# Altium integrated library Mastermind Devices.IntLib: 910 symbols (part 1 of 6) (continued)
## ATMEGA2560-16AU (continued)

## ATSAM3UxCA-AU
designator U?, comment ATSAM3U2CA-AU
IC MCU 32bit 128kB flash 100LQFP; Manufacturer: Atmel; 2nd source part number: 184-1662; Artikkelnr Noca: 15019073; Artikkelnr Simpro: N.A.; Part Number: ATSAM3U2CA-AU; Manufacturer Part Number: ATSAM3U2CA-AU; Datasheet: http://www.atmel.com/Images/6430s.pdf; LatestRevisionDate: 2012-06-01; Pin Count: 100; Publisher: Nordic Semiconductor; Published: 2012-06-01; Value: ATSAM3U2CA-AU; Note: *; Supplier: Digi-Key; Supplier part number: ATSAM3U2CA-AU-ND; 2nd source Supplier: Farnell; Footprint Doc: LQFP-100
footprint TSQFP50P1600X1600X160-100N
pins: 1 VDDANA (power), 2 ADVREF (in), 3 GNDANA (power), 4 AD12BVREF (io), 5 PA22/TXD2/RTS1/AD12B0 (io), 6 PA30/TF/TIOA2/AD12B1 (io), 7 PB3/PWMH3/A5/AD12BAB2 (io), 8 PB4/TCLK1/A6/AD12BAB3 (io), 9 VDDCORE (power), 10 PA13/MISO (io), 11 PA14/MOSI (io), 12 PA15/SPCK/PWMH2 (io), 13 PA16/NPCS0/NCS1 (io), 14 PA17/SCK0/ADTRG (io), 15 PB16/D7/PWMH3 (io), 16 PB15/D6/PWMH2 (io), 17 PA18/TXD0/PWMFI2 (io), 18 PA19/RXD0/NPCS3 (io), 19 PA20/TXD1/PWMH3 (io), 20 PA21/RXD1/PCK0 (io), 21 PA23/RXD2/CTS1 (io), 22 VDDIO (power), 23 PA24/TWD1/SCK1 (io), 24 PA25/TWCK1/SCK2 (io), 25 PA26/TD/TCLK2 (io), 26 PA0/TIOB0/NPCS1 (io), 27 PA1/TIOA0/NPCS2 (io), 28 PA2/TCLK0/AD12BTRG (io), 29 PA3/MCCK/PCK1 (io), 30 PA4/MCCDA/PWMH0 (io), 31 PA5/MCDA0/PWMH1 (io), 32 PA6/MCDA1/PWMH2 (io), 33 PA7/MCDA2/PWML0 (io), 34 VDDCORE (power), 35 GND (power), 36 VDDIO (power), 37 PA8/MCDA3/PWML1 (io), 38 PA9/TWD0/PWML2 (io), 39 PA10/TWCK0/PWML3 (io), 40 PA11/URXD/PWMFI0 (io), 41 PA12/UTXD/PWMFI1 (io), 42 FWUP (in), 43 ERASE (in), 44 TEST (in), 45 VDDBU (power), 46 GNDBU (power), 47 NRSTB (in), 48 JTAGSEL (in), 49 XOUT32 (out), 50 XIN32 (in), 51 TDI (in), 52 VDDOUT (power), 53 VDDIN (power), 54 TDO (out), 55 TMS (in), 56 TCK (in), 57 NRST (io), 58 NANDRDY/PCK1/PB24 (io), 59 VDDCORE (power), 60 VDDIO (power), 61 GND (power), 62 NWR0/NWE/PCK2/PB23 (io), 63 A22/NANDCLE/CTS2/PB22 (io), 64 A21(NANDALE/RTS2/PB21 (io), 65 NCS0/PWML3/PB20 (io), 66 NRD/PWML2/PB19 (io), 67 NANDWE/PWML1/PB18 (io), 68 NANDOE/PWML0/PB17 (io), 69 D5/PWMH1/PB14 (io), 70 D1/DSR0/PB10 (io), 71 D0/DTR0/PB9 (io), 72 GNDPLL (power), 73 VDDPLL (power), 74 XOUT (out), 75 XIN (in), 76 DHSDP (io), 77 DHSDM (io), 78 VBG (power), 79 VDDUTMI (power), 80 DFSDM (io), 81 DFSDP (io), 82 GNDUTMI (power), 83 VDDCORE (power), 84 TK/PWMH0/PA28 (io), 85 RK/PWMH1/PA29 (io), 86 RF/TIOB2/PA31 (io), 87 VDDCORE (power), 88 VDDIO (power), 89 GND (power), 90 PWMH0/A2/PB0 (io), 91 PWMH1/A3/PB1 (io), 92 PWMH2/A4/PB2 (io), 93 D2/DCD0/PB11 (io), 94 D3/RI0/PB12 (io), 95 D4/PWMH0/PB13 (io), 96 RD/PCK0/PA27 (io), 97 TIOA1/A7/AD0/PB5 (io), 98 TIOB1/D15/AD1/PB6 (io), 99 RTS0/A0/NBS0/AD2/PB7 (io), 100 CTS0/A1/AD3/PB8 (io)

## ATTINY10
designator IC?, comment ATtiny4/5/9/108-bit Microcontroller with 512/1024 Bytes In-System Programmable Flash
footprint SOT23-6
pins: 1 PB0, 2 GND (power), 3 PB1, 4 PB2, 5 VCC (power), 6 /RST

## ATTINY10-MAHR
designator IC?, comment ATtiny4/5/9/108-bit Microcontroller with 512/1024 Bytes In-System Programmable Flash
footprint UDFN-8
pins: 1 PB1, 4 GND (power), 5 PB0, 6 /RST, 7 VCC (power), 8 PB2

## ATTINY85-20SU
designator U?  (value not drawn)
8KB 2.7V~5.5V AVR 512Byte 20MHz FLASH 6 SOIC-8-208mil Microcontrollers (MCU/MPU/SOC) ROHS; Manufacturer: MICROCHIP(美国微芯); Add into BOM: yes; GPIO Ports Number: 6; ADC (Bit): 10bit; Peripheral/Function: PWM; Watchdog: 有; Symbol: ATTINY85-20SU; Device: ATTINY85-20SU; LCSC Part Name: ATTINY85-20SU; Supplier Part: C89852; Manufacturer Part: ATTINY85-20SU; Supplier Footprint: SOIC-8-208mil; JLCPCB Part Class: Extended Part; Datasheet: https://atta.szlcsc.com/upload/public/pdf/source/20201117/C89852_765368ABD68244126CE6B6218510DF2D.pdf; Supplier: LCSC; Convert to PCB: yes; CPU Core: AVR; Program Storage Size: 8KB; RAM Size: 512Byte; Operating Voltage Range: 2.7V~5.5V; CPU Maximum Speed: 20MHz; Program Memory Type: FLASH; EEPROM: 512Byte; Operating Temperature Range: -40℃~+85℃; DAC (Bit): -; PWM (Bit): -; Universal Serial Bus: -; Internal Comparator: -; communication protocol: -; Real-Time Clock: -; Infrared Data Association: -; Low-Voltage Detect: 有; CCP Capture/Compare: -; Secure Digital Input and Output: -; Direct Memory Access: -; Internal Oscillator: 有
footprint SOIC8_208MIL
pins: 1 PB5 (PCINT5/RESET/ADC0/DW), 2 PB3 (PCINT3/XTAL1/CLKI/OC1B/ADC3), 3 PB4 (PCINT4/XTAL2/CLKO/OC1B/ADC2), 4 GND, 5 PB0 (MOSI/DI/SDA/AIN0/OC0A/OC1A/AREF/PCINT0), 6 PB1 (MISO/DO/AIN1/OC0B/OC1A/PCINT1), 7 PB2 (SCK/USCK/SCL/ADC1/T0/INT0/PCINT2), 8 VCC

## AVRISP-6
designator ISP?, comment AVR ISP HEADER Standard 6 pin header for AVR programming  (value not drawn)
footprint AVRISP
footprint AVRISP - 2mm
pins: 1 MISO, 2 VCC, 3 SCK, 4 MOSI, 5 ~{RST}, 6 GND

## AVRISP-BOX
designator ISP?, comment AVR ISP HEADER Standard 6 pin header for AVR programming  (value not drawn)
footprint AVRISP-BOX
pins: 1 MISO, 2 VCC, 3 SCK, 4 MOSI, 5 ~{RST}, 6 GND

## AXP083-SAG
designator IC?
footprint SOT23
pins: 1 GND (power), 2 /RESET (out), 3 VCC (power)

## B3P-VH
designator J3  (value not drawn)
Connector Header Through Hole 3 position 0.156" (3.96mm)
footprint JST_B3P-VH(LF)(SN)
pins: 1, 2, 3

## B/C11L
designator SG?, comment BUZZER    Source: Buerklin
OC_FARNELL: unknown; OC_NEWARK: unknown
footprint B/C11L
pins: 1, 2

## B/C11S
designator SG?, comment BUZZER    Source: Buerklin
OC_FARNELL: unknown; OC_NEWARK: unknown
footprint B/C11S
pins: 1, 2

## B/C14L
designator SG?, comment BUZZER    Source: Buerklin
OC_FARNELL: unknown; OC_NEWARK: unknown
footprint B/C14L
pins: 1, 2

## B/C14S
designator SG?, comment BUZZER    Source: Buerklin
OC_FARNELL: unknown; OC_NEWARK: unknown
footprint B/C14S
pins: 1, 2

## B/C17L
designator SG?, comment BUZZER    Source: Buerklin
OC_FARNELL: unknown; OC_NEWARK: unknown
footprint B/C17L
pins: 1, 2

## B/C17S
designator SG?, comment BUZZER    Source: Buerklin
OC_FARNELL: unknown; OC_NEWARK: unknown
footprint B/C17S
pins: 1, 2

## BAT-BS-08-B2AA010-R
designator BT?, comment BS-08-B2AA010-R
Manufacturer: MYOUNG(美阳); Add into BOM: yes; Connector Type: Battery holder; Battery Type: CR2032; Symbol: BS-08-B2AA010-R; Device: BS-08-B2AA010-R; LCSC Part Name: 电池底座 适用电池:CR2032; Supplier Part: C964789; Manufacturer Part: BS-08-B2AA010-R; Supplier Footprint: SMD; JLCPCB Part Class: Extended Part; Datasheet: https://atta.szlcsc.com/upload/public/pdf/source/20210914/EC0558860453B885433DAC8FD5A891FD.pdf; Supplier: LCSC; Convert to PCB: yes; Contact Material: Phosphor Bronze; Operating Temperature Range: -25℃~+85℃
footprint BAT-SMD_MYOUNG_BS-08-B2AA010-R
3D model BAT-SMD_MYOUNG_BS-08-B2AA010-R
pins: 1 +, 2 -

## Battery
designator Bat?, comment Bat Holder CR2032
Bat Holder CR2032 SMD; Manufacturer: Comfortable; Manufacturer Part Number: BC-2001; 2nd source part number: 165-0693; Artikkelnr Noca: 55089011; Artikkelnr Simpro: N.A.; Part Number: Bat Holder CR2032 SMD; Datasheet: \\hizz\pro\app9717\Datasheet\connectores\Comfortable\BC-2001.pdf; Footprint Doc: CR2032_HOLDER_SMD; LatestRevisionDate: 2016-04-21; Pin Count: 3; Publisher: Nordic Semiconductor; Published: 2009-12-12; Value: Bat Holder CR2032; Note: Bat Holder CR2032; Supplier: Cabcon; Supplier part number: BC-2001/T & R; 2nd source Supplier: Farnell
footprint CR2032_HOLDER_SMD
pins: +, -

## BC847BPDW1T1G
designator Q?
45V 380mW,5V 100mA NPN+PNP SOT-363 Bipolar (BJT) ROHS; Manufacturer: onsemi(安森美); Add into BOM: yes; DC Current Gain (hFE@Ic,Vce): 200@2mA,5V; Transition Frequency (fT): 100MHz; Collector Cut-Off Current (Icbo): 15nA; Collector-Emitter Saturation Voltage (VCE(sat)@Ic,Ib): 600mV@5mA,100mA; Symbol: BC847BPDW1T1G; Device: BC847BPDW1T1G; Supplier: LCSC; Supplier Part: C232590; Manufacturer Part: BC847BPDW1T1G; JLCPCB Part Class: Extended Part; LCSC Part Name: 耐压:45V 电流:100mA NPN+PNP; Supplier Footprint: SOT-363; Datasheet: https://atta.szlcsc.com/upload/public/pdf/source/20181130/C232590_6CC5AF1A48F235F817BDBD4AE6CDE84D.pdf; Convert to PCB: yes; Transistor Type: NPN+PNP; Operating Temperature: -55℃~+150℃@(Tj)
footprint SOT-363
pins: 1 E, 2 B, 3 C, 4 E, 5 B, 6 C

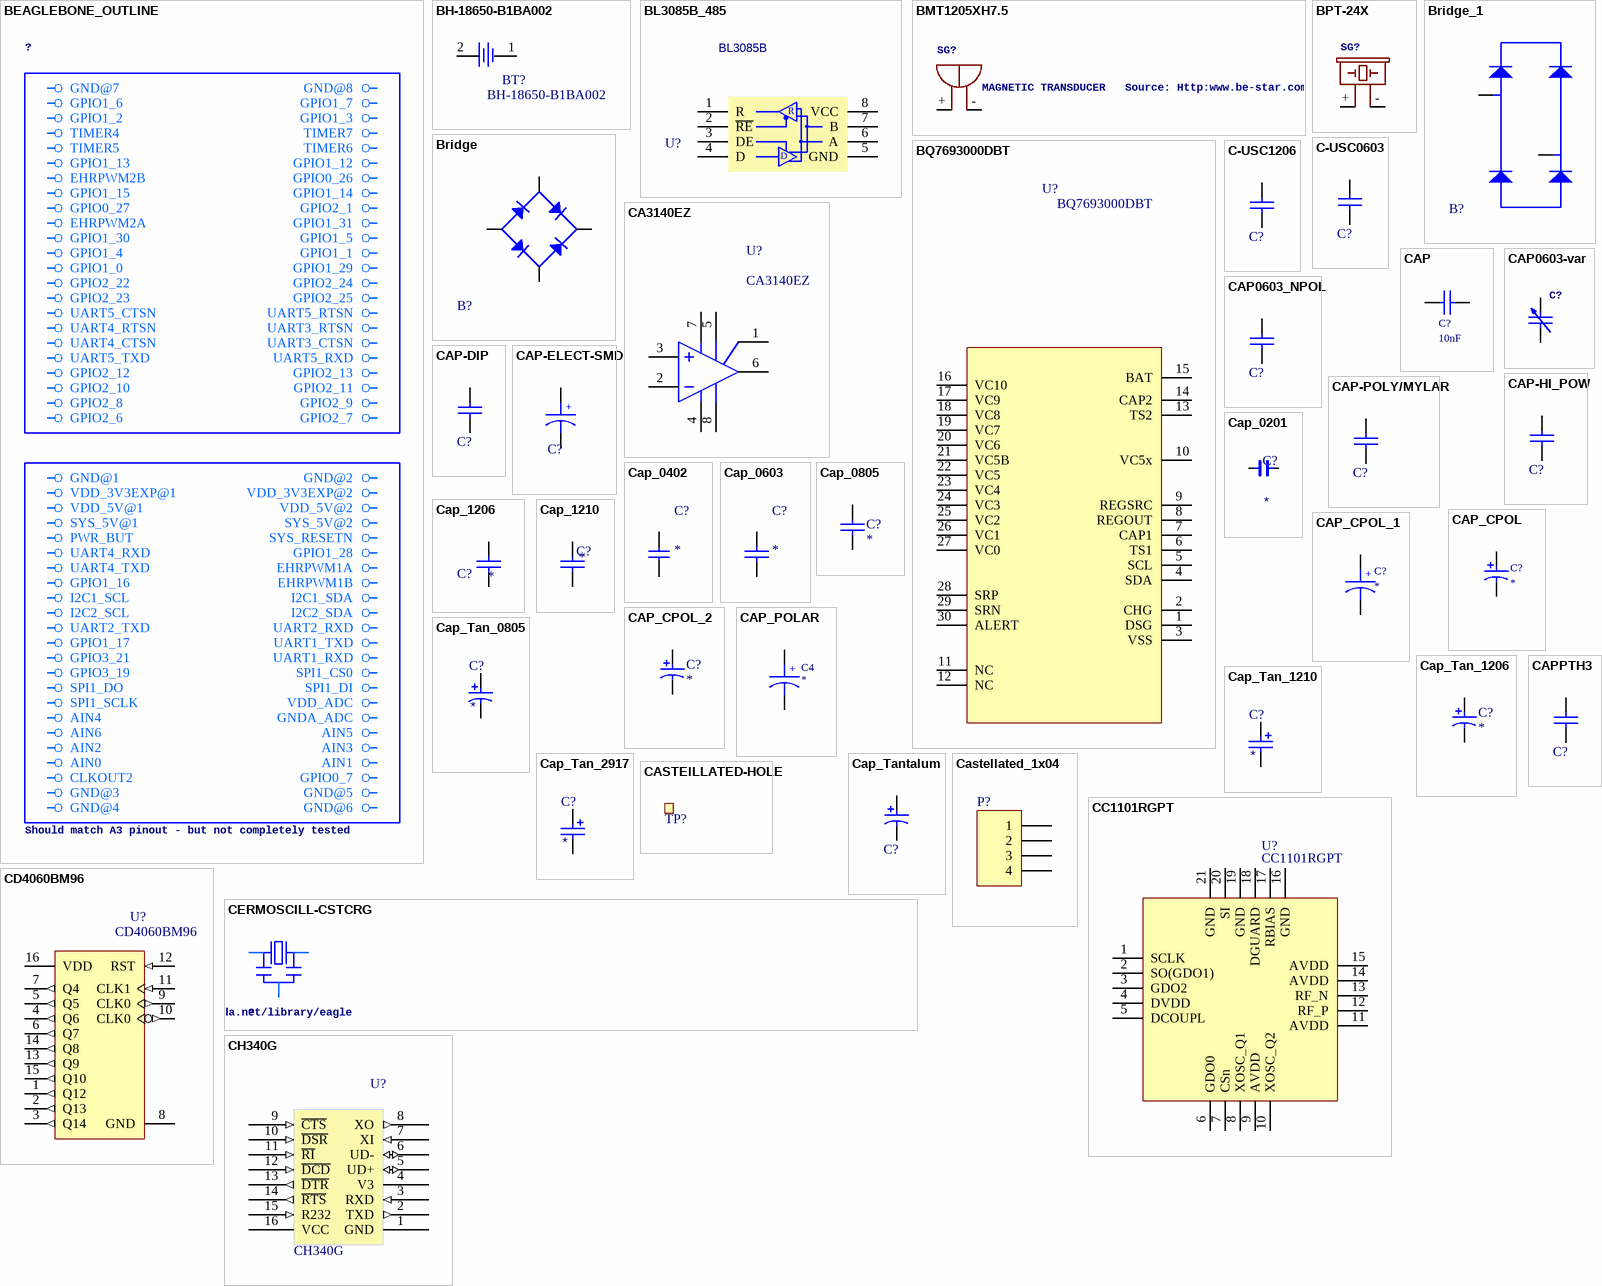
[diagram p7: symbols BEAGLEBONE_OUTLINE to CH340G]

## BEAGLEBONE_OUTLINE
designator ?, comment Should match A3 pinout - but not completely tested
footprint BEAGLEBONE_SHIELD
pins: 1 GND@7 (power), 2 GND@8 (power), 3 GPIO1_6, 4 GPIO1_7, 5 GPIO1_2, 6 GPIO1_3, 7 TIMER4, 8 TIMER7, 9 TIMER5, 10 TIMER6, 11 GPIO1_13, 12 GPIO1_12, 13 EHRPWM2B, 14 GPIO0_26, 15 GPIO1_15, 16 GPIO1_14, 17 GPIO0_27, 18 GPIO2_1, 19 EHRPWM2A, 20 GPIO1_31, 21 GPIO1_30, 22 GPIO1_5, 23 GPIO1_4, 24 GPIO1_1, 25 GPIO1_0, 26 GPIO1_29, 27 GPIO2_22, 28 GPIO2_24, 29 GPIO2_23, 30 GPIO2_25, 31 UART5_CTSN, 32 UART5_RTSN, 33 UART4_RTSN, 34 UART3_RTSN, 35 UART4_CTSN, 36 UART3_CTSN, 37 UART5_TXD, 38 UART5_RXD, 39 GPIO2_12, 40 GPIO2_13, 41 GPIO2_10, 42 GPIO2_11, 43 GPIO2_8, 44 GPIO2_9, 45 GPIO2_6, 46 GPIO2_7, 47 GND@1 (power), 48 GND@2 (power), 49 VDD_3V3EXP@1 (power), 50 VDD_3V3EXP@2 (power), 51 VDD_5V@1 (power), 52 VDD_5V@2 (power), 53 SYS_5V@1 (power), 54 SYS_5V@2, 55 PWR_BUT, 56 SYS_RESETN, 57 UART4_RXD, 58 GPIO1_28, 59 UART4_TXD, 60 EHRPWM1A, 61 GPIO1_16, 62 EHRPWM1B, 63 I2C1_SCL, 64 I2C1_SDA, 65 I2C2_SCL, 66 I2C2_SDA, 67 UART2_TXD, 68 UART2_RXD, 69 GPIO1_17, 70 UART1_TXD, 71 GPIO3_21, 72 UART1_RXD, 73 GPIO3_19, 74 SPI1_CS0, 75 SPI1_DO, 76 SPI1_DI, 77 SPI1_SCLK, 78 VDD_ADC, 79 AIN4, 80 GNDA_ADC, 81 AIN6, 82 AIN5, 83 AIN2, 84 AIN3, 85 AIN0 (power), 86 AIN1, 87 CLKOUT2, 88 GPIO0_7, 89 GND@3 (power), 90 GND@5 (power), 91 GND@4 (power), 92 GND@6 (power)

## BH-18650-B1BA002
designator BT?
Manufacturer: MYOUNG(美阳); Add into BOM: yes; Connector Type: Battery box; Battery Type: 18650; Symbol: BH-18650-B1BA002; Device: BH-18650-B1BA002; LCSC Part Name: 电池盒 适用电池:18650; Supplier Part: C2988620; Manufacturer Part: BH-18650-B1BA002; Supplier Footprint: SMD; JLCPCB Part Class: Extended Part; Datasheet: https://atta.szlcsc.com/upload/public/pdf/source/20220402/870DB99AB50CA0DF8D51CF7C86A51FAB.pdf; Supplier: LCSC; Convert to PCB: yes
footprint BATTERY-SMD_18650-1S-L77.1-W20.7-1
3D model BATTERY-SMD_18650-1S-L77.1-W20.7-1
pins: 1, 2

## BL3085B_485
designator U?, comment BL3085B
RS-485/RS-422 ICs ROHS; Manufacturer: BL(上海贝岭); spicePre: X; Manufacturer Part: BL3085B; Supplier: LCSC; Supplier Part: C110791; JLCPCB Part Class: Extended Part; spiceSymbolName: BL3085B
footprint SOIC-8_L4.9-W3.9-P1.27-LS6.0-BL
footprint SOIC-8E (SOIC, 8-Leads, Body 4.90x3.90mm, Pitch 1.27mm, IPC Medium Density)
pins: 1 R, 2 ~{RE}, 3 DE, 4 D, 5 GND (power), 6 A, 7 B (power), 8 VCC (power)

## BMT1205XH7.5
designator SG?, comment MAGNETIC TRANSDUCER   Source: Http:www.be-star.com
OC_FARNELL: unknown; OC_NEWARK: unknown
footprint BMT1205XH7.5
pins: +, -

## BPT-24X
designator SG?
OC_FARNELL: unknown; OC_NEWARK: unknown
footprint BPT-24X
pins: + 1, - 2

## BQ7693000DBT
designator U?
TSSOP-30-4.4mm Battery Management ROHS; Manufacturer: TI(德州仪器); Add into BOM: yes; Symbol: BQ7693000DBT; Device: BQ7693000DBT; LCSC Part Name: BQ7693000DBT; Supplier Part: C2870190; Manufacturer Part: BQ7693000DBT; Supplier Footprint: TSSOP-30-4.4mm; JLCPCB Part Class: Extended Part; Datasheet: https://www.ti.com/cn/lit/gpn/bq76930; Supplier: LCSC; Convert to PCB: yes
footprint TSSOP-30_L7.8-W4.4-P0.50-LS6.4-BL
pins: 1 DSG, 2 CHG, 3 VSS, 4 SDA, 5 SCL, 6 TS1, 7 CAP1, 8 REGOUT, 9 REGSRC, 10 VC5x, 11 NC, 12 NC, 13 TS2, 14 CAP2, 15 BAT, 16 VC10, 17 VC9, 18 VC8, 19 VC7, 20 VC6, 21 VC5B, 22 VC5, 23 VC4, 24 VC3, 25 VC2, 26 VC1, 27 VC0, 28 SRP, 29 SRN, 30 ALERT

## Bridge
designator B?
footprint MBS
pins: +, -, AC1, AC2

## Bridge_1
designator B?
footprint MBS
pins: +, -, AC1, AC2

## C-USC0603
designator C?, comment 10%  (value not drawn)
Chip Capacitor
footprint C0603
pins: 1, 2

## C-USC1206
designator C?, comment 10%  (value not drawn)
Chip Capacitor; ComponentLink1Description: New link; ComponentLink1URL: *
footprint C1206
pins: 1, 2

## CA3140EZ
designator U?
Single channel 10pA 9V/us 2mV DIP-8 Operational Amplifier ROHS; Manufacturer: RENESAS(瑞萨)/IDT; Device: CA3140EZ_C122729; Add into BOM: yes; Number of Circuits: 单路; Gain Bandwidth Product(GBP): 4.5MHz; Voltage - Input Offset(Vos): 5mV; Output Current: 40mA; Supply Current: 4mA; Symbol: CA3140EZ; LCSC Part Name: CA3140EZ; Supplier Part: C122729; Manufacturer Part: CA3140EZ; Supplier Footprint: DIP-8; JLCPCB Part Class: Extended Part; Datasheet: https://atta.szlcsc.com/upload/public/pdf/source/20170719/C122729_1500460909361828614.pdf; Supplier: LCSC; Convert to PCB: yes; Current - Input Bias(Ib): 10pA; Slew Rate(SR): 9V/us; -3db Bandwidth: -; Operating Temperature: -55℃~+125℃
footprint SOIC-8_L4.9-W3.9-P1.27-LS6.0-BL
pins: 1 OS NULL, 2 IN-, 3 IN+, 4 V-, 5 OS NULL, 6 OUT, 7 V+, 8 NC

## CAP
designator C?, comment 10nF
Capacitor; AEMS Code: 2100341
footprint CC1005-0402
footprint CC1608-0603
footprint CC2012-0805
footprint CC3216-1206
footprint CC3225-1210
signal-integrity model Guessed Model (Capacitor Model Details Guessed by Setup Helper)
3D model SMT_0603 (PCB3D Model)
3D model SMT_0805 (PCB3D Model)
footprint C0805
footprint C0603
pins: 1, 2

## CAP0603-var
designator C?, comment CAP0603-Non_Polar  (value not drawn)
footprint C0603
pins: 1, 2

## CAP0603_NPOL
designator C?, comment 10%  (value not drawn)
Chip capacitor
footprint C0603
pins: 1, 2

## CAP-DIP
designator C?, comment N.C  (value not drawn)
Polyester or Mylar capacitor; Value: N.C
footprint dipcap
footprint C-7.68mm
footprint CAP_MYLAR-7.62mm
footprint CAP_MYLAR_7.68mm
footprint MYLAR - 11.6mm
footprint MYLAR - 18mm
footprint mylar - 25MM
footprint MYLAR - 30MM
footprint CAP - 5.08_CERAMIC
pins: 1, 2

## CAP-ELECT-SMD
designator C?, comment uF  (value not drawn)
Smd Aluminum Electrolytic Capacitor; Value: uF
footprint CAP-SMD_BD4.0-L4.3-W4.3-LS5.1-FD
footprint CAP-SMD_BD6.3-L6.6-W6.6-FD-1
footprint CAP-SMD_BD12.5-L13.0-W13.0-LS14.4-FD
footprint CAP-SMD_BD9.5-L10.0-W10.0-LS12.4-FD
footprint CAP-SMD_BD6.3-L6.6-W6.6-FD-1 - TH
footprint CAP-SMD_BD8.0-L8.3-W8.3-FD
pins: 1 +, 2 -

## CAP-HI_POW
designator C?, comment N.C  (value not drawn)
Polyester or Mylar capacitor; Value: N.C
footprint CAP- 56x27mm
footprint CAP- 58x33mm
pins: 1, 2

## CAP-POLY/MYLAR
designator C?, comment N.C  (value not drawn)
Polyester or Mylar capacitor; Value: N.C
footprint dipcap
footprint C-7.68mm
footprint CAP_MYLAR-7.62mm
footprint CAP_MYLAR_7.68mm
footprint MYLAR - 11.6mm
footprint MYLAR - 18mm
footprint mylar - 25MM
footprint MYLAR - 30MM
footprint MYLAR - 15mm
pins: 1, 2

## Cap_0201
designator C?
CAP CER ?nF 25V X7R 0201; Value: *
footprint CAP_0201
pins: 1, 2

## Cap_0402
designator C?
CAP CER ?nF ?V X7R 0402; Value: *
footprint C0402-NO
footprint C0402
pins: 1, 2

## Cap_0603
designator C?
CAP CER ?nF ?V X7R 0603; Value: *
footprint CAPC1608X06L
footprint C0603
footprint C0603-NO
pins: 1, 2

## Cap_0805
designator C?
CAP CER ?nF ?V X7R 0805; Value: *
footprint C0805
footprint C0805-NO
pins: 1, 2

## Cap_1206
designator C?
CAP CER ?nF ?V X7R 1206; Manufacturer: N.A.; Specification: X7R, ±10%, 16V; Value: *
footprint C1206-NO
footprint C1206
pins: 1, 2

## Cap_1210
designator C?
CAP CER ?nF ?V X7R 1210; Value: *
footprint C1210-NO
footprint C1210
footprint C1210K
pins: 1, 2

## CAP_CPOL
designator C?
CAP ALUM ?UF 20% ?V RADIAL; Value: *
footprint MCCT-A (3216 Polar Capacitor)
footprint MCCT-B (3528 Polar Capacitor)
footprint MCCT-C (6032 Polar Capacitor)
footprint MCCT-D (7343 Polar Capacitor)
footprint RB8/3.5
footprint CAPPR2.5-6x7
footprint CAPPR2-5X6.8
3D model Cap5x6_8 (PCB3D Model)
pins: 1, 2

## CAP_CPOL_1
designator C?
Polar Capacitor; Value: *
footprint MCCT-A (3216 Polar Capacitor)
footprint MCCT-B
footprint MCCT-C (6032 Polar Capacitor)
footprint MCCT-D (7343 Polar Capacitor)
3D model MCCTB (PCB3D Model)
pins: 1, 2
text: +

## CAP_CPOL_2
designator C?
Polar Capacitor; Value: *
footprint MCCT-A (3216 Polar Capacitor)
footprint MCCT-B
footprint MCCT-C (6032 Polar Capacitor)
footprint MCCT-D (7343 Polar Capacitor)
footprint RAD01
3D model SMT_0603 (PCB3D Model)
3D model SMT_0805 (PCB3D Model)
pins: 1, 2

## CAP_POLAR
designator C4
Polar Capacitor; Value: *
footprint MCCT-A (3216 Polar Capacitor)
footprint MCCT-B
footprint MCCT-C (6032 Polar Capacitor)
footprint MCCT-D (7343 Polar Capacitor)
pins: 1, 2
text: +

## Cap_Tan_0805
designator C?
CAP TANT ?UF 10% ?V 0805; Value: *
footprint CAP_TAN_P0805
pins: 1, 2
1 alternate drawing of the same symbol

## Cap_Tan_1206
designator C?
CAP TANT ?UF 10% ?V 1206; Value: *
footprint CAP_TAN_A1206
pins: 1, 2
1 alternate drawing of the same symbol

## Cap_Tan_1210
designator C?
CAP TANT ?UF 10% ?V 1210; Value: *
footprint CAP_TAN_B1210
pins: 1, 2
1 alternate drawing of the same symbol

## Cap_Tan_2917
designator C?
CAP TANT ?UF 10% ?V 2917; Value: ??
footprint CAP_TAN_D2917
pins: 1, 2
1 alternate drawing of the same symbol

## Cap_Tantalum
designator C?  (value not drawn)
CAP TANT ?UF 10% 35V; Value: *
footprint 2917_CAP_taltium
footprint 2412_CAP_taltium
footprint tantalum  A
pins: 1, 2

## CAPPTH3
designator C?
footprint CouplingCap (VARISTOR)
pins: 1, 2

## Castellated_1x04
designator P?  (no BOM)
Header, 4-Pin; LatestRevisionDate: 17-Jul-2002; LatestRevisionNote: Re-released for DXP Platform.; Publisher: Altium Limited
footprint Castellated_1X04
pins: 1, 2, 3, 4

## CASTElLLATED-HOLE
designator TP?, comment TP  (value not drawn)  (no BOM)
V_Cut Hole; Part Number: Testpoint TH; Artikkelnr Noca: N.A.; Manufacturer: *; Manufacturer Part Number: *; Datasheet: *; Footprint Doc: TESTPAD-TH; LatestRevisionDate: 2009-12-12; Pin Count: 1; Publisher: Nordic Semiconductor; Published: 2009-12-12; Value: TP; Note: *; Supplier: *; Supplier part number: *; 2nd source Supplier: *; 2nd source part number: *; Artikkelnr Simpro: N.A.
footprint CastellatedHole_Ø.9mm
footprint CastellatedHole_Ø.6mm
pins: 1

## CC1101RGPT
designator U?
500Kbps ISM SPI QFN-20-EP(4x4) RF Transceiver ICs ROHS; Manufacturer: TI(德州仪器); Contributor: LCSC; nameAlias: Value; Supplier: LCSC; Supplier Part: C2654650; Manufacturer Part: CC1101RGPT; JLCPCB Part Class: Extended Part; spicePre: U; spiceSymbolName: CC1101RGPT
footprint QFN-20_L4.0-W4.0-P0.50-BL-EP2.4
pins: 1 SCLK, 2 SO(GDO1), 3 GDO2, 4 DVDD, 5 DCOUPL, 6 GDO0, 7 CSn, 8 XOSC_Q1, 9 AVDD, 10 XOSC_Q2, 11 AVDD, 12 RF_P, 13 RF_N, 14 AVDD, 15 AVDD, 16 GND, 17 RBIAS, 18 DGUARD, 19 GND, 20 SI, 21 GND

## CD4060BM96
designator U?
Manufacturer: TI(德州仪器); Add into BOM: yes; Logic Type: Binary Counter; Direction: 向上计数器; Supply Voltage: 3V~18V; Number of Elements: 1; Number of Bits per Element: 14; Trigger Type: 负边沿; Reset Style: 异步; Count Rate: 12MHz; Symbol: CD4060BM96; Device: CD4060BM96; LCSC Part Name: 12MHz 14位二进制计数器; Supplier Part: C32699; Manufacturer Part: CD4060BM96; Supplier Footprint: SOIC-16; JLCPCB Part Class: Extended Part; Datasheet: https://www.ti.com/cn/lit/gpn/cd4060b; Supplier: LCSC; Convert to PCB: yes; Timing mode: -; Operating Temperature: -55℃~+125℃
footprint SOIC-16_L9.9-W3.9-P1.27-LS6.0-BL
3D model SOIC-16_L9.9-W3.9-H1.8-LS6.0-P1.27
footprint SO-16
pins: 1 Q12 (out), 2 Q13 (out), 3 Q14 (out), 4 Q6 (out), 5 Q5 (out), 6 Q7 (out), 7 Q4 (out), 8 GND, 9 CLK0 (out), 10 CLK0 (out), 11 CLK1 (in), 12 RST (in), 13 Q9 (out), 14 Q8 (out), 15 Q10 (out), 16 VDD

## CERMOSCILL-CSTCRG
designator ?, comment Ceramic oscillator with built in capacitors such as ZTT-12MHz    http://www.ladyada.net/library/eagle
footprint CSTCR-G
pins: 1 IN, 2 GND, 3 OUT

## CH340G
designator U?
USB to Serial Chip CH340; GateName_1: G$1; SymbolName_1: CH340G
footprint SO-16
pins: 1 GND, 2 TXD (out), 3 RXD (in), 4 V3, 5 UD+ (io), 6 UD- (io), 7 XI (in), 8 XO (out), 9 ~{CTS} (in), 10 ~{DSR} (in), 11 ~{RI} (in), 12 ~{DCD} (in), 13 ~{DTR} (out), 14 ~{RTS} (out), 15 R232 (in), 16 VCC